# Altium footprint library 1.05-直插电感、共模电感.PcbLib: 35 footprints (part 3 of 3)
Each footprint in its own frame and in the unit in brackets; x right, y up, seen from the top. Pads: shape width x height; smd on the part's side, far side on the other; paste and mask are expansions set on the pad; w line width, h text height; cw(c..) or ccw(c..) is an arc to the next point about the centre after c.
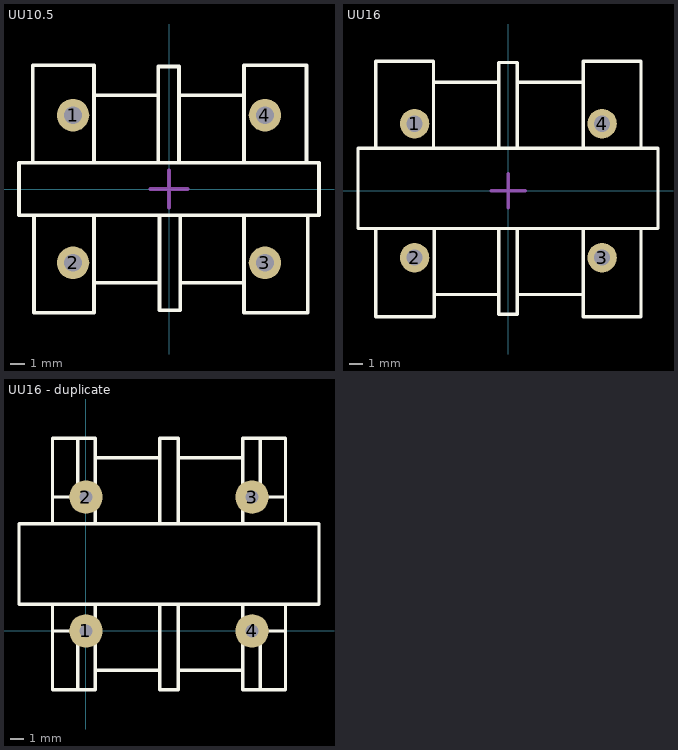
[diagram p2: the footprints below, top view; thin cyan lines are the x and y axes]

## UU10.5 [mm] "18*16*20mm(长宽高）           联系卖家 免费查找封装"
pads (4):
  round 2.2 hole 1.2: 1(-6.5,5) 2(-6.5,-5) 3(6.5,-5) 4(6.5,5)
Top Overlay:
  lines w0.254: -9.229,1.904 -9.229,8.382 -5.08,8.382 -5.08,1.904 ; -9.144,-1.81 -9.144,-8.382 -5.08,-8.382 -5.08,-1.81 ; -5.08,-6.35 -0.638,-6.35 ; -5.08,6.35 -0.723,6.35 ; -0.723,1.904 -0.723,8.304 0.677,8.304 0.677,1.904 ; -0.638,-1.81 -0.638,-8.21 0.762,-8.21 0.762,-1.81 ; 0.677,6.35 5.08,6.35 ; 0.762,-6.35 5.08,-6.35 ; 5.08,-1.904 5.08,-8.382 9.398,-8.382 9.398,-1.904 ; 5.08,1.904 5.08,8.382 9.313,8.382 9.313,1.904 ; -10.16,-1.778 -10.16,1.778 10.16,1.778 10.16,-1.778 -10.16,-1.778
Mechanical 15:
  lines w0.254: -1.27,0 1.27,0 ; 0,-1.27 0,1.27
3D body: height 3, standoff -21.5, extent -9.4,-8 9.4,8

## UU16 [mm] "22*17.5*23mm(长宽高）            联系卖家 免费查找封装"
pads (4):
  round 2.2 hole 1.2: 1(-7,5) 2(-7,-5) 3(7,-5) 4(7,5)
Top Overlay:
  lines w0.254: -9.906,-2.826 -9.906,-9.398 -5.523,-9.398 -5.523,-2.826 ; -9.906,3.174 -9.906,9.652 -5.588,9.652 -5.588,3.174 ; -5.523,-7.749 -0.723,-7.749 ; -5.523,8.097 -0.723,8.097 ; -0.723,-2.826 -0.723,-9.226 0.677,-9.226 0.677,-2.826 ; -0.723,3.174 -0.723,9.574 0.677,9.574 0.677,3.174 ; 0.677,-7.749 5.477,-7.749 ; 0.677,8.097 5.477,8.097 ; 5.588,-2.92 5.588,-9.398 9.906,-9.398 9.906,-2.92 ; 5.588,3.174 5.588,9.652 9.906,9.652 9.906,3.174 ; -11.223,-2.826 11.177,-2.826 11.177,3.174 -11.223,3.174 -11.223,-2.826
Mechanical 15:
  lines w0.254: -1.27,0 1.27,0 ; 0,-1.27 0,1.27
3D body: height 3, standoff -22.5, extent -11,-8.75 11,8.75

## UU16 - duplicate [mm] "联系卖家 免费查找封装"
pads (4):
  round 2.5 hole 1: 1(0,0) 2(0,10) 3(12.4,10) 4(12.4,0)
Top Overlay:
  lines w0.254: -2.5,8 -2.5,9.996 ; 0.7,-2.923 5.5,-2.923 ; 0.7,2 0.7,-4.4 -0.6,-4.4 ; 0.7,8 0.7,14.4 -0.6,14.4 ; 0.7,12.923 5.5,12.923 ; 5.5,2 5.5,-4.4 6.9,-4.4 6.9,2 ; 5.5,8 5.5,14.4 6.9,14.4 6.9,8 ; 6.9,-2.923 11.7,-2.923 ; 6.9,12.923 11.7,12.923 ; 11.7,2 11.7,-4.4 13,-4.4 ; 11.7,8 11.7,14.4 13,14.4 ; -2.5,0 -2.5,0.004 ; -2.5,0 -0.6,0 -0.6,-4.4 ; -2.5,0 -2.5,0.004 ; -2.5,0 -2.5,2 -2.5,0.004 ; -2.5,0.004 -2.5,-4.4 -0.6,-4.4 ; -2.5,9.996 -2.5,14.4 -0.6,14.4 ; -2.5,9.996 -2.5,10 -0.6,10 -0.6,14.4 ; 13,-4.4 14.9,-4.4 14.9,0.004 ; 13,-4.4 13,0 14.9,0 ; 13,14.4 14.9,14.4 14.9,9.996 ; 13,14.4 13,10 14.9,10 ; 14.9,0 14.9,0.004 ; 14.9,0 14.9,0.004 ; 14.9,0 14.9,2 14.9,0.004 ; 14.9,9.996 14.9,10 ; 14.9,9.996 14.9,8 14.9,10 ; 14.9,9.996 14.9,10 ; -5,2 17.4,2 17.4,8 -5,8 -5,2
3D body: height 25.55, standoff -3.8, extent -4.917,-4.35 17.317,14.35